# Altium footprint library X98_CARRIER_V1R2_12082022.PcbLib: 104 footprints (part 7 of 7)
Each footprint in its own frame and in the unit in brackets; x right, y up, seen from the top. Pads: shape width x height; smd on the part's side, far side on the other; paste and mask are expansions set on the pad; w line width, h text height; cw(c..) or ccw(c..) is an arc to the next point about the centre after c.
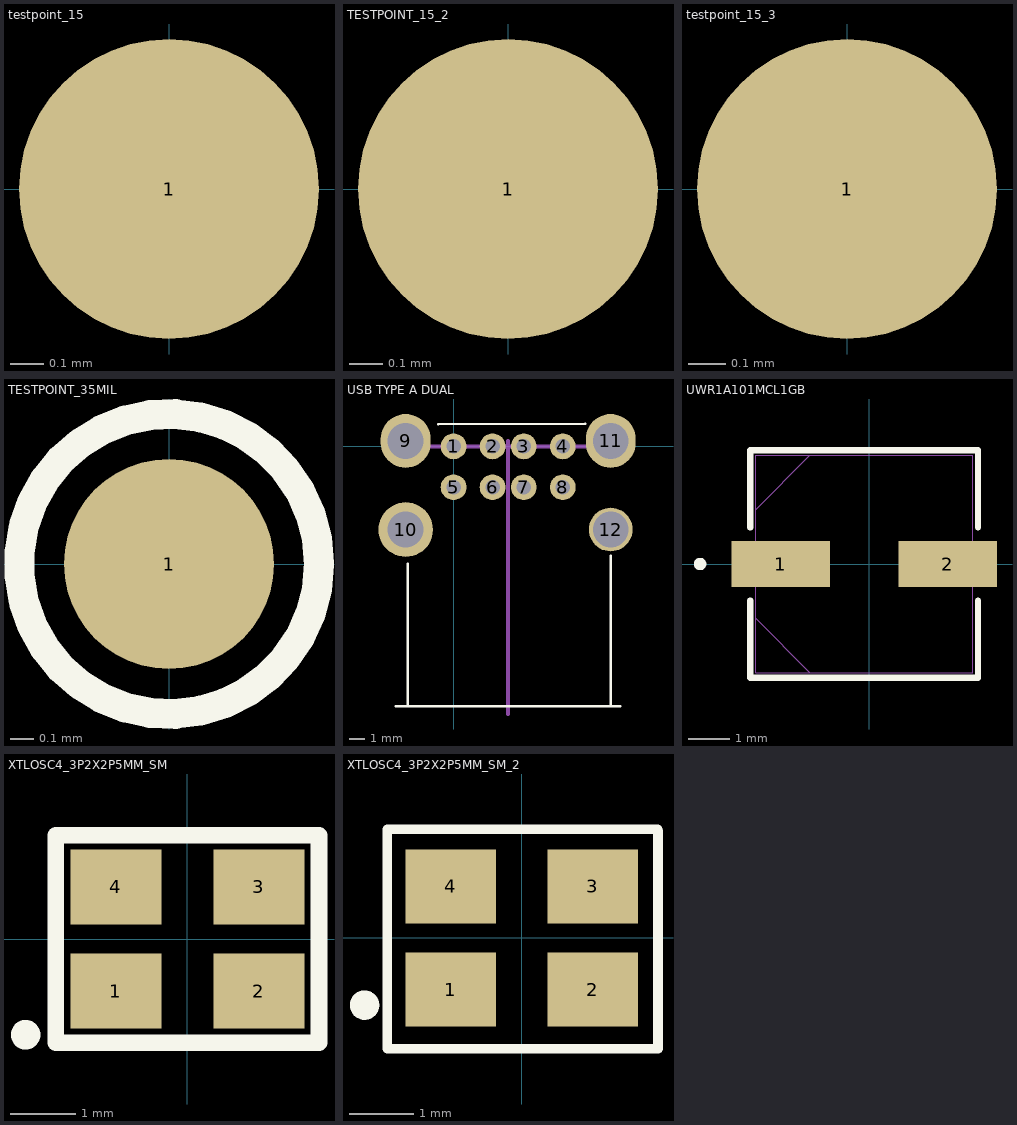
[diagram p6: the footprints below, top view; thin cyan lines are the x and y axes]

## testpoint_15 [mil]
height 43.31
pads (1):
  round 35 smd paste-39.37 mask+0: 1(0,0)

## TESTPOINT_15_2 [mil]
pads (1):
  round 35 smd mask+0: 1(0,0)

## testpoint_15_3 [mm]
pads (1):
  round 0.8 smd mask+0: 1(0,0)

## TESTPOINT_35MIL [mil]
height 43.31
pads (1):
  round 35 smd: 1(0,0)
Top Overlay:
  circle w5: c0,0 r25

## USB TYPE A DUAL [mm]
pads (12):
  round 1.65 hole 0.92: 1(0,0) 2(2.5,0) 3(4.5,0) 4(7,0) 5(0,-2.62) 6(2.5,-2.62) 7(4.5,-2.62) 8(7,-2.62)
  oval 3.2x3.45 hole 2.3 mask+0.076: 9(-3.07,0.35)
  round 3.5 hole 2.3: 10(-3.07,-5.33)
  oval 3.2x3.45 hole 2.3: 11(10.07,0.35)
  round 2.8 hole 2.3: 12(10.07,-5.33)
Top Overlay:
  lines w0.152: -3.725,-16.655 10.675,-16.655 ; -2.93,-16.65 -2.93,-7.524 ; -0.976,1.412 8.448,1.448 ; 10.07,-16.65 10.07,-7
Mechanical 15:
  lines w0.254: -3.07,0 10.07,0 ; 3.5,-17.15 3.5,0.35
3D body "DS1096-BN0S-FE.STP": height 16.8, standoff -3.06, extent -4.505,-16.555 11.495,1.755

## UWR1A101MCL1GB [mm] "0.209\"\" L x 0.209\"\" W (5.30mm x 5.30mm) cap"
height 5.5
pads (2):
  rect 2.411x1.113 smd paste+0 mask+0: 1(-2.168,0) 2(1.914,0)
Top Overlay:
  circle w0.152: c-4.135,0 r0.076
  lines w0.152: -2.908,-0.889 -2.908,-2.781 2.654,-2.781 2.654,-0.889 ; -2.908,0.889 -2.908,2.781 2.654,2.781 2.654,0.889
Mechanical 13:
  circle w0: c-2.273,0 r0.076
  lines w0.025: -2.781,-1.327 -1.454,-2.654 ; -2.781,1.327 -1.454,2.654 ; -2.781,-2.654 -2.781,2.654 2.527,2.654 2.527,-2.654 -2.781,-2.654
3D body "CAP_UWF_5X5P4_NCH.step": height 5.57, standoff 0, extent -3.073,-2.654 2.819,2.654
3D body: height 0.25, standoff 0, extent -0.127,0 0.127,0.254

## XTLOSC4_3P2X2P5MM_SM [mm]
pads (4):
  rect 1.4x1.15 smd mask+0.051: 1(-1.1,-0.8) 2(1.1,-0.8) 3(1.1,0.8) 4(-1.1,0.8)
Top Overlay:
  circle w0.254: c-2.489,-1.473 r0.102
  lines w0.254: -2.025,-1.6 2.025,-1.6 2.025,1.6 -2.025,1.6 -2.025,-1.6
3D body "User Library-tsx-3225-1.STEP": height 0.6, standoff 0, extent -1.6,-1.25 1.6,1.25

## XTLOSC4_3P2X2P5MM_SM_2 [mm]
pads (4):
  rect 1.4x1.15 smd: 1(-1.1,-0.8) 2(1.1,-0.8) 3(1.1,0.8) 4(-1.1,0.8)
Top Overlay:
  circle w0.254: c-2.438,-1.041 r0.102
  lines w0.152: 2.104,1.685 -2.087,1.685 -2.087,-1.718 2.112,-1.718 2.112,1.66
3D body "User Library-tsx-3225-1.STEP": height 0.6, standoff 0, extent -1.6,-1.25 1.6,1.25